# Altium footprint library 430 integreted.PcbLib: 281 footprints (part 8 of 18)
Each footprint in its own frame and in the unit in brackets; x right, y up, seen from the top. Pads: shape width x height; smd on the part's side, far side on the other; paste and mask are expansions set on the pad; w line width, h text height; cw(c..) or ccw(c..) is an arc to the next point about the centre after c.
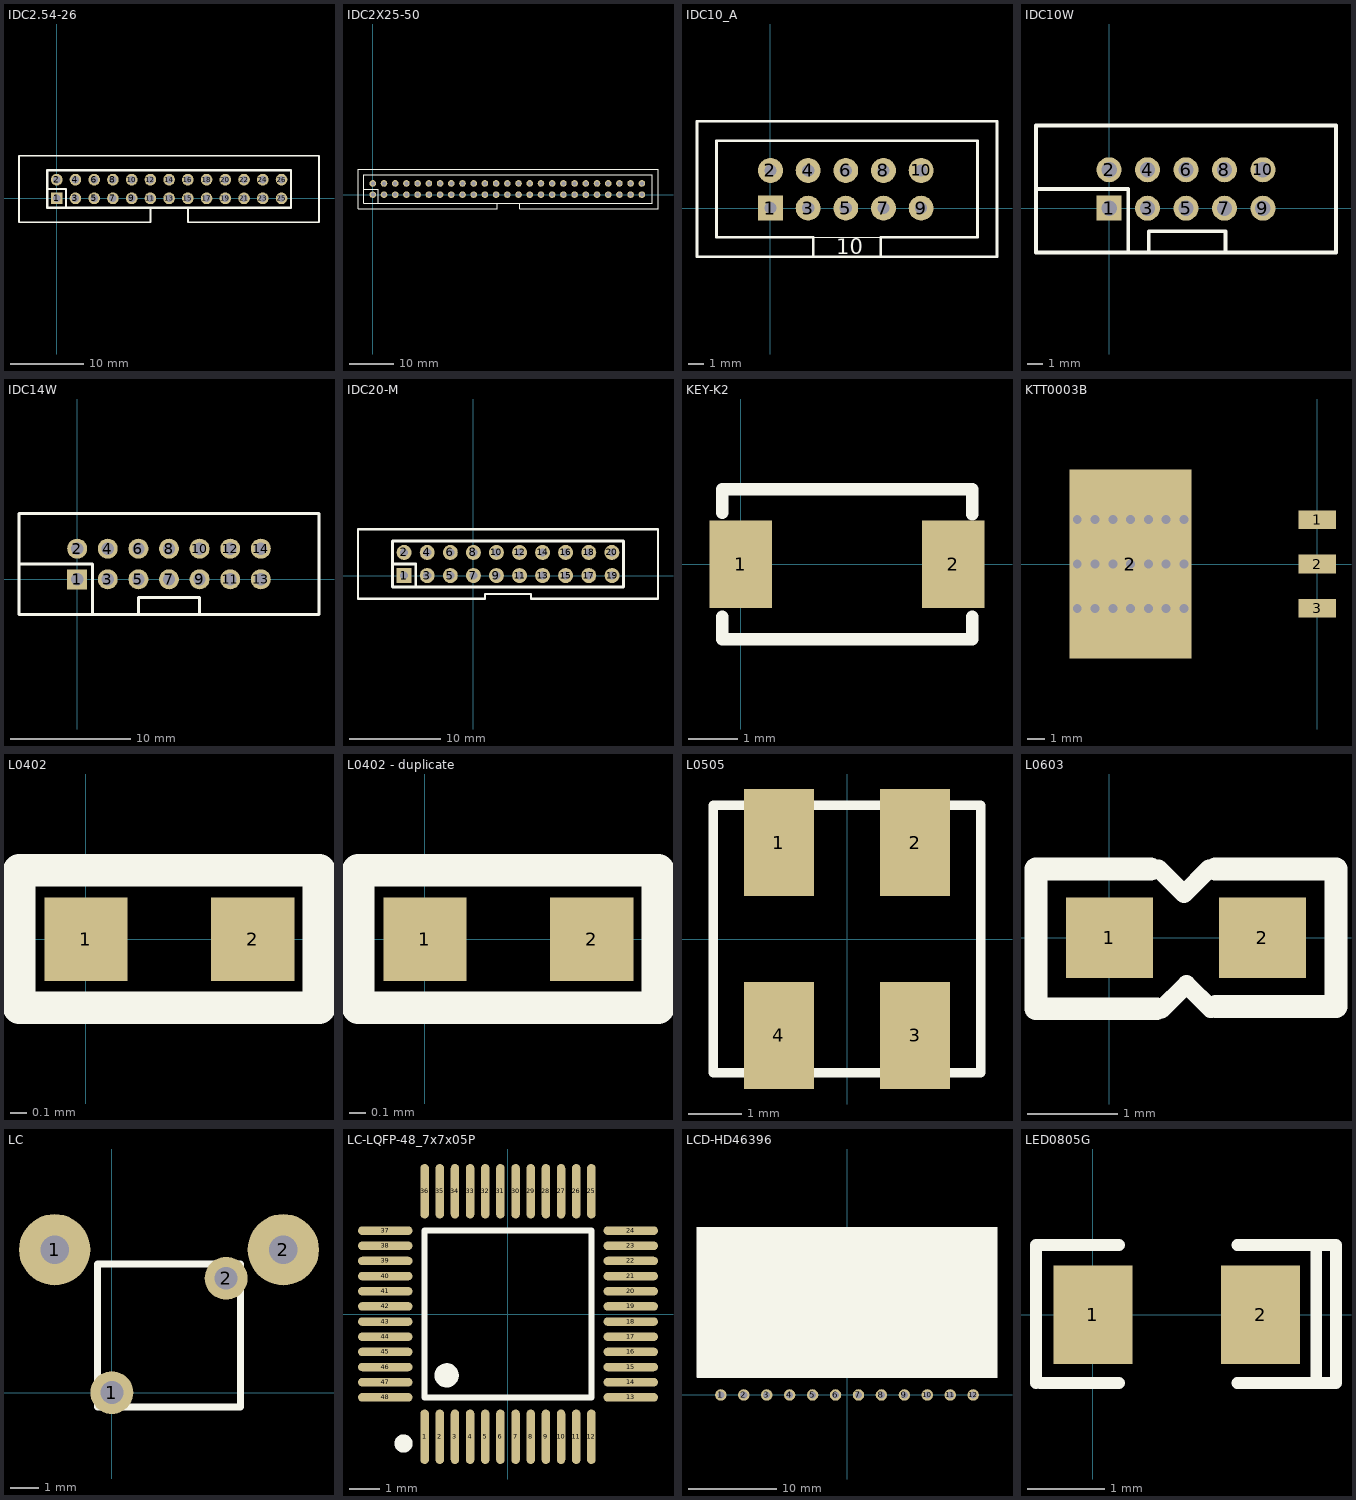
[diagram p7: the footprints below, top view; thin cyan lines are the x and y axes]

## IDC2.54-26 [mil]
pads (26):
  rect 62x62 hole 39.37: 1(0,0)
  round 62 hole 39.37: 2(0,100) 3(100,0) 4(100,100) 5(200,0) 6(200,100) 7(300,0) 8(300,100) 9(400,0) 10(400,100) 11(500,0) 12(500,100) 13(600,0) 14(600,100) 15(700,0) 16(700,100) 17(800,0) 18(800,100) 19(900,0) 20(900,100) 21(1000,0) 22(1000,100) 23(1100,0) 24(1100,100) 25(1200,0) 26(1200,100)
Top Overlay:
  lines w10: 500,-50 500,-127.17 -201.18,-127.17 -201.18,227.16 1400,227.16 1400,-127.17 700,-127.17 700,-50
  lines w12: -50,50 50,50 50,-50 ; -50,-50 -50,150 1250,150 1250,-50 -50,-50

## IDC2X25-50 [mm]
pads (50):
  round 1.5 hole 0.9: 1(0,0) 2(0,2.54) 3(2.54,0) 4(2.54,2.54) 5(5.08,0) 6(5.08,2.54) 7(7.62,0) 8(7.62,2.54) 9(10.16,0) 10(10.16,2.54) 11(12.7,0) 12(12.7,2.54) 13(15.24,0) 14(15.24,2.54) 15(17.78,0) 16(17.78,2.54) 17(20.32,0) 18(20.32,2.54) 19(22.86,0) 20(25.4,0) 21(22.86,2.54) 22(25.4,2.54) 23(27.94,0) 24(27.94,2.54) 25(30.48,0) 26(30.48,2.54) 27(33.02,0) 28(33.02,2.54) 29(35.56,0) 30(35.56,2.54) 31(38.1,0) 32(38.1,2.54) 33(40.64,0) 34(40.64,2.54) 35(43.18,0) 36(43.18,2.54) 37(45.72,0) 38(45.72,2.54) 39(48.26,0) 40(48.26,2.54) 41(50.8,0) 42(50.8,2.54) 43(53.34,0) 44(53.34,2.54) 45(55.88,0) 46(55.88,2.54) 47(58.42,0) 48(58.42,2.54) 49(60.96,0) 50(60.96,2.54)
Top Overlay:
  lines w0.178: -2.007,1.27 1.27,1.27 1.27,-1.93 ; 28.143,-1.955 28.143,-3.226 -3.353,-3.226 -3.353,5.791 64.618,5.791 64.618,-3.226 33.325,-3.226 33.325,-1.93 ; -2.007,-1.93 33.807,-1.93 63.271,-1.93 63.271,4.47 -2.007,4.47 -2.007,-1.93

## IDC10_A [mil]
pads (10):
  rect 65x65 hole 32 square: 1(0,0)
  round 65 hole 32 square: 2(0,98.43) 3(98.43,0) 4(98.43,98.43) 5(196.85,0) 6(196.85,98.43) 7(295.28,0) 8(295.28,98.42) 9(393.7,0) 10(393.7,98.43)
Top Overlay:
  lines w3: 111.42,-75.98 288.58,-75.98
  lines w7: 111.42,-126.77 111.42,-75.98 -140.94,-75.98 -140.94,175.98 540.95,175.98 540.95,-75.98 288.58,-75.98 288.58,-127.17 ; 288.58,-127.17 592.13,-127.17 592.13,227.16 -192.13,227.16 -192.13,-127.17 111.02,-127.17 288.58,-127.17
  text "10" at 172.05,-120.08 h40

## IDC10W [mil]
pads (10):
  rect 65x65 hole 40: 1(0,0)
  round 65 hole 40: 2(0,100) 3(100,0) 4(100,100) 5(200,0) 6(200,100) 7(300,0) 8(300,100) 9(400,0) 10(400,100)
Top Overlay:
  lines w10: -190,50 50,50 50,-115 ; 103,-115 103,-60 303,-60 303,-115 ; 590,213 590,-115 -190,-115 -190,215 590,215

## IDC14W [mil]
pads (14):
  rect 65x65 hole 40: 1(0.04,0.04)
  round 65 hole 40: 2(0.04,100.04) 3(100.04,0.04) 4(100.04,100.04) 5(200.04,0.04) 6(200.04,100.04) 7(300.04,0.04) 8(300.04,100.04) 9(400.04,0.04) 10(400.04,100.04) 11(500.04,0.04) 12(500.04,100.04) 13(600.04,0.04) 14(600.04,100.04)
Top Overlay:
  lines w10: -189.96,50.04 50.04,50.04 50.04,-114.96 ; 200.04,-114.96 200.04,-59.96 400.04,-59.96 400.04,-114.96 ; -189.96,-114.96 -189.96,215.04 790.04,215.04 790.04,-114.96 -189.96,-114.96
3D body: height 341.34, standoff -134.25, extent -196.82,-124.72 800.82,223.3

## IDC20-M [mil]
pads (20):
  rect 65x65 hole 35: 1(-300,0)
  round 65 hole 35: 2(-300,100) 3(-200,0) 4(-200,100) 5(-100,0) 6(-100,100) 7(0,0) 8(0,100) 9(100,0) 10(100,100) 11(200,0) 12(200,100) 13(300,0) 14(300,100) 15(399.91,0) 16(399.91,100) 17(500,0) 18(500,100) 19(601,0) 20(600,100)
Top Overlay:
  lines w10: -500,-100 -500,200 800,200 800,-100 250,-100 250,-80 50,-80 50,-100 -500,-100
  lines w12: -350,50 -250,50 -250,-50 ; -350,-50 -350,150 650,150 650,-50 -350,-50

## KEY-K2 [mil]
pads (2):
  rect 50x70 smd: 1(0,0) 2(170,0)
Top Overlay:
  lines w10: -15,-42 -15,-60 185,-60 185,-42 ; -15,41 -15,60 185,60 185,40
3D body: height 78.74, standoff -3.94, extent -12.6,-58 182.6,60.11

## KTT0003B [mil]
pads (24):
  rect 85x42 smd: 1(0,100) 2(0,0) 3(0,-100)
  round 2 hole 20: 2(-540,-100) 2(-540,0) 2(-540,100) 2(-500,-100) 2(-500,0) 2(-500,100) 2(-460,-100) 2(-460,0) 2(-460,100) 2(-420,-100) 2(-420,100) 2(-380,-100) 2(-380,0) 2(-380,100) 2(-340,-100) 2(-340,0) 2(-340,100) 2(-300,-100) 2(-300,0) 2(-300,100)
  rect 275x425 hole 20: 2(-420.5,0)

## L0402 [mil]
pads (2):
  rect 20x20 smd: 1(0,0) 2(40,0)
Top Overlay:
  lines w7.87: -16.07,-16.42 -16.07,16.58 55.93,16.58 55.93,-16.42 -16.07,-16.42
3D body: height 10, standoff 0, extent 3.43,-10 36.43,10
3D body: height 10, standoff 0, extent 0.43,-10 3.43,10
3D body: height 10, standoff 0, extent 36.43,-10 39.43,10

## L0402 - duplicate [mil]
pads (2):
  rect 20x20 smd: 1(0,0) 2(40,0)
Top Overlay:
  lines w7.87: -16.07,-16.42 55.93,-16.42 55.93,16.58 -16.07,16.58 -16.07,-16.42
3D body: height 10, standoff 0, extent 36.43,-10 39.43,10
3D body: height 10, standoff 0, extent 0.43,-10 3.43,10
3D body: height 10, standoff 0, extent 3.43,-10 36.43,10

## L0505 [mm]
pads (4):
  rect 1.3x2 smd: 1(-1.27,1.8) 2(1.27,1.8) 3(1.27,-1.8) 4(-1.27,-1.8)
Top Overlay:
  lines w0.178: -2.5,-2.5 2.5,-2.5 2.5,2.5 -2.5,2.5 -2.5,-2.5

## L0603 [mil]
pads (2):
  rect 38x35 smd: 1(0,0) 2(66.87,0)
Top Overlay:
  lines w8: 21.47,30.27 32.6,19.14 43.58,30.12 ; 22.7,-31.36 33.7,-20.36 44.32,-30.98
  lines w10: 18.1,30 -32,30 -32,-31 20.7,-31 ; 46.4,30 99,30 99,-30 46.6,-30
3D body: height 20, standoff 0, extent 12,-15 56,15
3D body: height 20, standoff 0, extent 56,-15 64,15
3D body: height 20, standoff 0, extent 4,-15 12,15

## LC [mil]
pads (4):
  round 100 hole 40: 1(-80,200) 2(240,200)
  round 60 hole 32: 1(0,0) 2(160,160)
Top Overlay:
  lines w10: -20,-20 -20,180 180,180 180,-20 160,-20 -20,-20

## LC-LQFP-48_7x7x05P [mm]
pads (48):
  oval 0.28x1.8 smd mask+0.051: 1(-2.75,-4.05) 2(-2.25,-4.05) 3(-1.75,-4.05) 4(-1.25,-4.05) 5(-0.75,-4.05) 6(-0.25,-4.05) 7(0.25,-4.05) 8(0.75,-4.05) 9(1.25,-4.05) 10(1.75,-4.05) 11(2.25,-4.05) 12(2.75,-4.05) 25(2.75,4.05) 26(2.25,4.05) 27(1.75,4.05) 28(1.25,4.05) 29(0.75,4.05) 30(0.25,4.05) 31(-0.25,4.05) 32(-0.75,4.05) 33(-1.25,4.05) 34(-1.75,4.05) 35(-2.25,4.05) 36(-2.75,4.05)
  oval 1.8x0.28 smd mask+0.051: 13(4.05,-2.75) 14(4.05,-2.25) 15(4.05,-1.75) 16(4.05,-1.25) 17(4.05,-0.75) 18(4.05,-0.25) 19(4.05,0.25) 20(4.05,0.75) 21(4.05,1.25) 22(4.05,1.75) 23(4.05,2.25) 24(4.05,2.75) 37(-4.05,2.75) 38(-4.05,2.25) 39(-4.05,1.75) 40(-4.05,1.25) 41(-4.05,0.75) 42(-4.05,0.25) 43(-4.05,-0.25) 44(-4.05,-0.75) 45(-4.05,-1.25) 46(-4.05,-1.75) 47(-4.05,-2.25) 48(-4.05,-2.75)
Top Overlay:
  circle w0.4: c-2.025,-2.025 r0.2
  circle w0.3: c-3.45,-4.275 r0.15
  lines w0.2: -2.75,-2.75 -2.75,2.75 2.75,2.75 2.75,-2.75 -2.75,-2.75
3D body: height 1.1, standoff 0, extent -4.522,-4.496 4.496,4.521

## LCD-HD46396 [mm]
pads (12):
  round 1.3 hole 0.8: 1(-14.3,0) 2(-11.7,0) 3(-9.1,0) 4(-6.5,0) 5(-3.9,0) 6(-1.3,0) 7(1.3,0) 8(3.9,0) 9(6.5,0) 10(9.1,0) 11(11.7,0) 12(14.3,0)
Top Overlay:
  rectangle: -17,2 17,19
  lines w0.127: -17,2 17,2 17,19 -17,19 -17,2

## LED0805G [mil]
pads (2):
  rect 40x50 smd: 1(0,0) 2(85,0)
Top Overlay:
  lines w5.98: 113.15,-34.61 123.15,-34.61 ; 113.15,35.39 123.15,35.39
  lines w6: -28.86,-34.61 -28.86,35.39 13.15,35.39 ; -26.85,-34.61 13.15,-34.61 ; 73.15,-34.61 113.15,-34.61 113.15,35.39 73.15,35.39 ; 123.15,-34.61 123.15,35.39
3D body: height 43.31, standoff 0, extent 3.39,-24.21 82.91,25